# Altium footprint library PcbLib_Discrete.PcbLib: 118 footprints (part 6 of 8)
Each footprint in its own frame and in the unit in brackets; x right, y up, seen from the top. Pads: shape width x height; smd on the part's side, far side on the other; paste and mask are expansions set on the pad; w line width, h text height; cw(c..) or ccw(c..) is an arc to the next point about the centre after c.
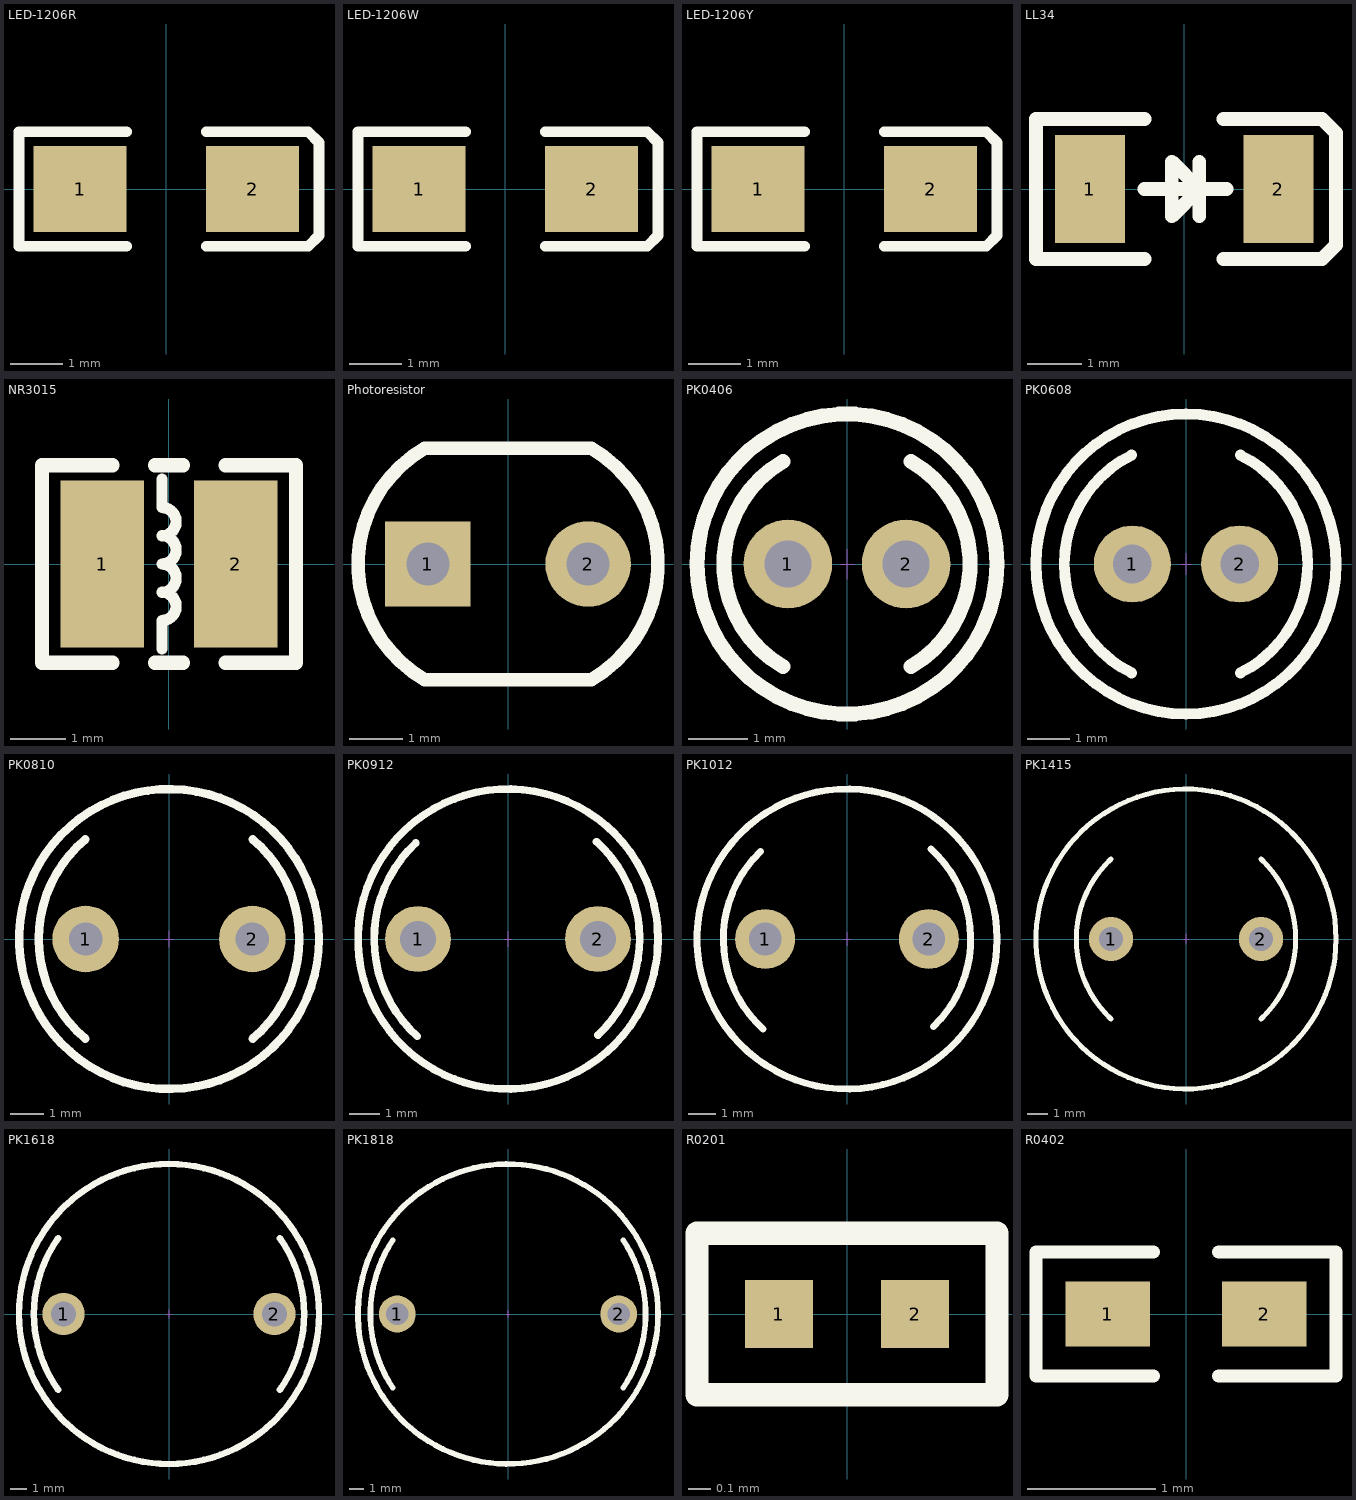
[diagram p5: the footprints below, top view; thin cyan lines are the x and y axes]

## LED-1206R [mil]
pads (2):
  rect 70x65 smd: 1(-65,0) 2(65,0)
Top Overlay:
  lines w8: -111,43 -111,-43 -30,-43 ; -109,43 -30,43 ; 30,-43 107,-43 115,-35 115,35 107,43 30,43
3D body "6.STEP": height 39.57, standoff -0.04, extent -63.03,-31.54 63.04,31.54

## LED-1206W [mil]
pads (2):
  rect 70x65 smd: 1(-65,0) 2(65,0)
Top Overlay:
  lines w8: -111,43 -111,-43 -30,-43 ; -109,43 -30,43 ; 30,-43 107,-43 115,-35 115,35 107,43 30,43
3D body "5.STEP": height 39.57, standoff -0.04, extent -65,-31.54 61.06,31.54

## LED-1206Y [mil]
pads (2):
  rect 70x65 smd: 1(-65,0) 2(65,0)
Top Overlay:
  lines w8: -111,43 -111,-43 -30,-43 ; -109,43 -30,43 ; 30,-43 107,-43 115,-35 115,35 107,43 30,43
3D body "4.STEP": height 39.57, standoff -0.04, extent -68.03,-31.54 58.03,31.54

## LL34 [mm] "玻封二极管"
pads (2):
  rect 1.3x2 smd: 1(-1.75,0) 2(1.75,0)
Top Overlay:
  lines w0.254: -2.75,-1.301 -0.734,-1.301 ; -2.75,-1.25 -2.75,1.25 ; -2.75,1.301 -0.734,1.301 ; -0.734,0 0.79,0 ; 0.282,-0.508 0.282,0.508 ; 0.734,-1.301 2.563,-1.301 2.822,-1.041 2.822,1.041 2.563,1.301 0.734,1.301 ; -0.226,-0.508 0.282,0 -0.226,0.508 -0.226,-0.508
3D body "SOD-80.STEP": height 1.5, standoff 0, extent -1.722,-0.75 1.778,0.75

## NR3015 [mm] "3mm*3mm*1.5mm(长*宽*高）"
pads (2):
  rect 1.5x3 smd: 1(-1.2,0) 2(1.2,0)
Top Overlay:
  lines w0.203: -0.127,-1.524 -0.127,-1.016 ccw(c-0.127,-0.762) -0.127,-0.508 ccw(c-0.127,-0.254) -0.127,0 ccw(c-0.127,0.254) -0.127,0.508 ccw(c-0.127,0.762) -0.127,1.016 -0.127,1.524
  lines w0.254: -1.016,-1.778 -2.286,-1.778 -2.286,1.778 -1.016,1.778 ; -0.254,-1.778 0.254,-1.778 ; -0.254,1.778 0.254,1.778 ; 1.016,-1.778 2.286,-1.778 2.286,1.778 1.016,1.778
3D body "NR3015.STEP": height 1.45, standoff 0.05, extent -1.5,-1.5 1.5,1.5

## Photoresistor [mm]
pads (2):
  rect 1.6x1.6 hole 0.8: 1(-1.5,0)
  round 1.6 hole 0.8: 2(1.5,0)
Top Overlay:
  lines w0.254: -1.557,-2.169 cw(c-0.305,0) -1.557,2.169 1.557,2.169 cw(c0.305,0) 1.557,-2.169 -1.557,-2.169
3D body "RG5528-.STEP": height 1.9, standoff -3.45, extent -2.5,-2.15 2.5,2.15

## PK0406 [mm] "2*5*8mm(脚距，直径，高）"
pads (2):
  round 1.5 hole 0.8: 1(-1,0) 2(1,0)
Top Overlay:
  circle w0.254: c0,0 r2.54
  lines w0.254: -1.08,-1.739 cw(c-0.076,0) -1.08,1.739 ; 1.08,-1.739 ccw(c0.076,0) 1.08,1.739
Mechanical 15:
  lines w0.01: -0.127,0 0.127,0 ; 0,-0.254 0,0.254
3D body "PK0406.STEP": height 8.02, standoff -2.78, extent -2.5,-2.5 2.5,2.5

## PK0608 [mm] "2.5*7*10mm(脚距，直径，高）"
pads (2):
  round 1.8 hole 0.9: 1(-1.25,0) 2(1.25,0)
Top Overlay:
  circle w0.254: c0,0 r3.5
  lines w0.254: -1.27,-2.54 cw(c0,0) -1.27,2.54 ; 1.27,-2.54 ccw(c0,0) 1.27,2.54
Mechanical 15:
  lines w0.01: -0.127,0 0.127,0 ; 0,-0.254 0,0.254
3D body "PK0608.STEP": height 10.02, standoff -2.78, extent -3.5,-3.5 3.5,3.5

## PK0810 [mm] "5*9*12mm(脚距，直径，高）"
pads (2):
  round 2 hole 1: 1(-2.5,0) 2(2.5,0)
Top Overlay:
  circle w0.254: c0,0 r4.5
  lines w0.254: -2.51,-2.991 cw(c0,0) -2.51,2.991 ; 2.51,-2.991 ccw(c0,0) 2.51,2.991
Mechanical 15:
  lines w0.01: -0.127,0 0.127,0 ; 0,-0.254 0,0.254
3D body "PK0810.STEP": height 12.02, standoff -2.78, extent -4.5,-4.5 4.5,4.5

## PK0912 [mm] "6*10*14mm(脚距，直径，高）"
pads (2):
  round 2.2 hole 1.2: 1(-3,0) 2(3,0)
Top Overlay:
  circle w0.254: c0,0 r5
  lines w0.254: -3.076,3.2 ccw(c-0.076,0) -3.027,-3.246 ; 2.951,3.246 cw(c0,0) 3,-3.2
Mechanical 15:
  lines w0.01: -0.127,0 0.127,0 ; 0,-0.254 0,0.254
3D body "PK0912.STEP": height 14.02, standoff -2.78, extent -5,-5 5,5

## PK1012 [mm] "6*11*14mm(脚距，直径，高）"
pads (2):
  round 2.2 hole 1.2: 1(-3,0) 2(3,0)
Top Overlay:
  circle w0.254: c0,0 r5.5
  lines w0.254: -3.178,3.205 ccw(c-0.076,0) -3.076,-3.3 ; 3.076,3.3 cw(c0.076,0) 3.178,-3.205
Mechanical 15:
  lines w0.01: -0.127,0 0.127,0 ; 0,-0.254 0,0.254
3D body "PK1012.STEP": height 14.02, standoff -2.78, extent -5.5,-5.5 5.5,5.5

## PK1415 [mm] "7.5*15*17mm(脚距，直径，高）"
pads (2):
  round 2.2 hole 1.2: 1(-3.75,0) 2(3.75,0)
Top Overlay:
  circle w0.254: c0,0 r7.5
  lines w0.254: -3.75,-4 cw(c0,0) -3.75,4 ; 3.75,-4 ccw(c0,0) 3.75,4
Mechanical 15:
  lines w0.01: -0.127,0 0.127,0 ; 0,-0.254 0,0.254
3D body "PK1415.STEP": height 17.02, standoff -2.78, extent -7.5,-7.5 7.5,7.5

## PK1618 [mm] "12.5*17*20mm(脚距，直径，高）"
pads (2):
  round 2.5 hole 1.5: 1(-6.25,0) 2(6.25,0)
Top Overlay:
  circle w0.381: c0,0 r8.89
  lines w0.381: -6.555,-4.5 cw(c-0.305,0) -6.555,4.5 ; 6.555,-4.5 ccw(c0.305,0) 6.555,4.5
Mechanical 15:
  lines w0.01: -0.127,0 0.127,0 ; 0,-0.254 0,0.254
3D body "PK1618.STEP": height 20.02, standoff -2.78, extent -8.5,-8.5 8.5,8.5

## PK1818 [mm] "15*19*20mm(脚距，直径，高）"
pads (2):
  round 2.5 hole 1.5: 1(-7.5,0) 2(7.5,0)
Top Overlay:
  circle w0.381: c0,0 r10.16
  lines w0.381: -7.805,-5 cw(c-0.305,0) -7.805,5 ; 7.805,-5 ccw(c0.305,0) 7.805,5
Mechanical 15:
  lines w0.01: -0.127,0 0.127,0 ; 0,-0.254 0,0.254
3D body "PK1818.STEP": height 20.03, standoff -2.77, extent -9.5,-9.5 9.5,9.5

## R0201 [mm] "1/20W (0.05W)"
pads (2):
  rect 0.3x0.3 smd: 1(-0.3,0) 2(0.3,0)
Top Overlay:
  lines w0.102: -0.66,-0.356 -0.66,0.356 0.66,0.356 0.66,-0.356 -0.66,-0.356
3D body "Res-0201.STEP": height 0.24, standoff -0.01, extent -0.325,-0.162 0.325,0.162

## R0402 [mil] "1/16W (0.0625W)"
pads (2):
  rect 26x20 smd: 1(-24,0) 2(24,0)
Top Overlay:
  lines w4: -10,-19 -46,-19 -46,19 -10,19 ; 10,-19 46,-19 46,19 10,19
3D body "RESC-0402-Black.STEP": height 16.14, standoff 0, extent -23.01,-10.82 18.33,10.83